# Altium footprint library IC.PcbLib: 97 footprints (part 1 of 7)
Each footprint in its own frame and in the unit in brackets; x right, y up, seen from the top. Pads: shape width x height; smd on the part's side, far side on the other; paste and mask are expansions set on the pad; w line width, h text height; cw(c..) or ccw(c..) is an arc to the next point about the centre after c.
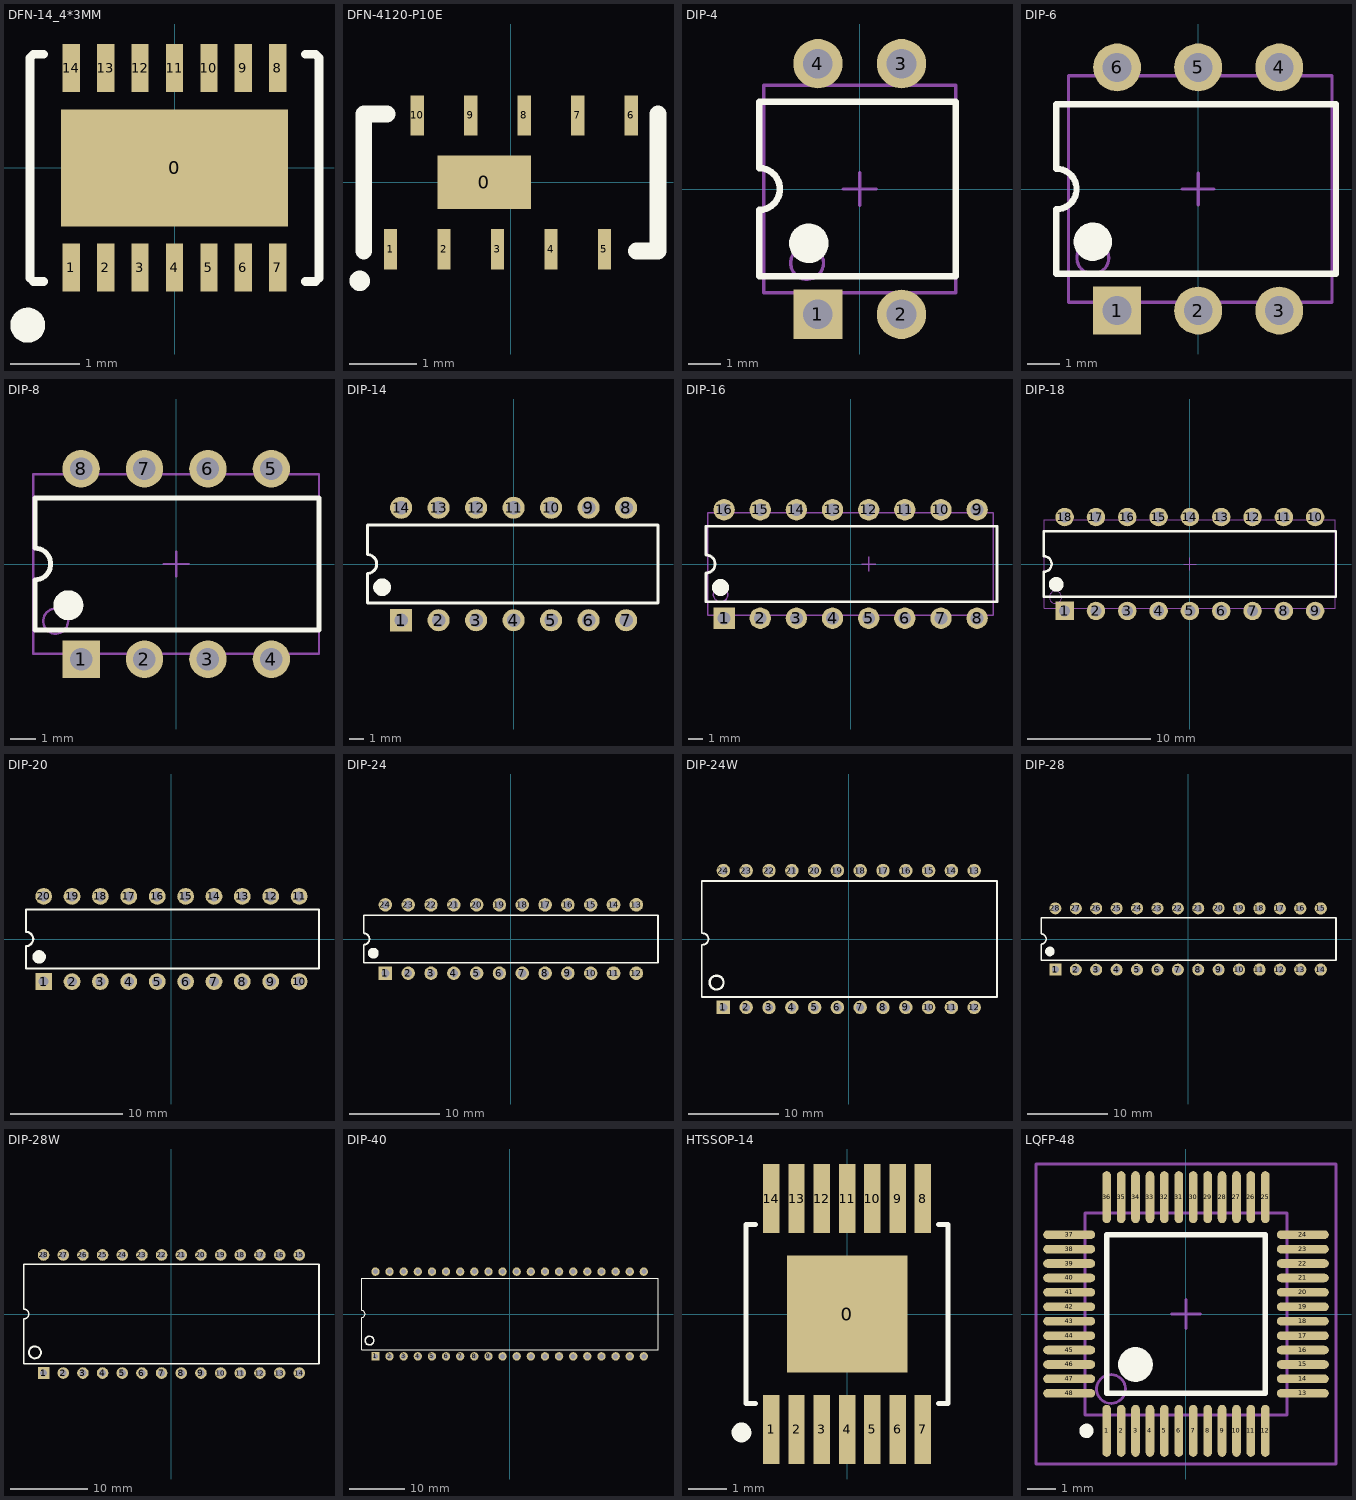
[diagram p0: the footprints below, top view; thin cyan lines are the x and y axes]

## DFN-14_4*3MM [mm]
pads (15):
  rect 3.3x1.7 smd: 0(0,0)
  rect 0.25x0.7 smd: 1(-1.5,-1.45) 2(-1,-1.45) 3(-0.5,-1.45) 4(0,-1.45) 5(0.5,-1.45) 6(1,-1.45) 7(1.5,-1.45) 8(1.5,1.45) 9(1,1.45) 10(0.5,1.45) 11(0,1.45) 12(-0.5,1.45) 13(-1,1.45) 14(-1.5,1.45)
Top Overlay:
  circle w0.254: c-2.134,-2.286 r0.127
  lines w0.127: -1.905,-1.651 -2.049,-1.651 -2.1,-1.6 -2.1,1.6 -2.049,1.651 -1.905,1.651 ; 1.905,-1.651 2.049,-1.651 2.1,-1.6 2.1,1.6 2.049,1.651 1.905,1.651
3D body "User Library-DFN-14.STEP": height 0.75, standoff 0, extent -2.007,-1.5 1.993,1.5

## DFN-4120-P10E [mm]
pads (11):
  rect 1.4x0.8 smd: 0(-0.4,0)
  rect 0.2x0.6 smd: 1(-1.8,-1) 2(-1,-1) 3(-0.2,-1) 4(0.6,-1) 5(1.4,-1) 6(1.8,1) 7(1,1) 8(0.2,1) 9(-0.6,1) 10(-1.4,1)
Top Overlay:
  circle w0.254: c-2.261,-1.473 r0.025
  lines w0.254: -2.2,-1.025 -2.2,1.025 -1.854,1.025 ; 1.88,-1.025 2.2,-1.025 2.2,1.025

## DIP-4 [mm] "DIP; 4 Leads; Row Spacing 7.62 mm; Pitch 2.54 mm"
height 5.6
pads (4):
  rect 1.5x1.5 hole 0.9: 1(-1.27,-3.81)
  round 1.5 hole 0.9: 2(1.27,-3.81) 3(1.27,3.81) 4(-1.27,3.81)
Top Overlay:
  circle w0.6: c-1.55,-1.65 r0.3
  lines w0.2: -3.058,-2.65 -3.058,-0.635 ccw(c-3.058,0) -3.058,0.635 -3.058,2.65 ; -3.048,-2.65 2.921,-2.65 2.921,2.65 -3.048,2.65
Mechanical 13:
  circle w0.1: c-1.6,-2.25 r0.5
  lines w0.1: -2.921,-3.15 2.921,-3.15 2.921,3.15 -2.921,3.15 -2.921,-3.15
Mechanical 15:
  lines w0.1: -0.5,0 0.5,0 ; 0,-0.5 0,0.5
3D body "CircuitWorks-DIP4.step": height 4.31, standoff -3.28, extent -2.794,-4 2.746,4

## DIP-6 [mm] "DIP; 6 Leads; Row Spacing 7.62 mm; Pitch 2.54 mm"
height 5.46
pads (6):
  rect 1.5x1.5 hole 0.9: 1(-2.54,-3.81)
  round 1.5 hole 0.9: 2(0,-3.81) 3(2.54,-3.81) 4(2.54,3.81) 5(0,3.81) 6(-2.54,3.81)
Top Overlay:
  circle w0.6: c-3.302,-1.651 r0.3
  lines w0.2: -4.446,-2.65 -4.446,-0.635 ccw(c-4.446,0) -4.446,0.635 -4.446,2.65 ; -4.445,-2.65 4.318,-2.65 4.318,2.65 -4.445,2.65
Mechanical 13:
  circle w0.1: c-3.302,-2.159 r0.5
  lines w0.1: -4.064,-3.55 4.191,-3.55 4.191,3.55 -4.064,3.55 -4.064,-3.55
Mechanical 15:
  lines w0.1: -0.5,0 0.5,0 ; 0,-0.5 0,0.5
3D body "CircuitWorks-DIP6.step": height 4.31, standoff -3.28, extent -4.016,-4 4.064,4

## DIP-8 [mm] "DIP; 8 Leads; Row Spacing 7.62 mm; Pitch 2.54 mm"
height 5.08
pads (8):
  rect 1.5x1.5 hole 0.9: 1(-3.81,-3.81)
  round 1.5 hole 0.9: 2(-1.27,-3.81) 3(1.27,-3.81) 4(3.81,-3.81) 5(3.81,3.81) 6(1.27,3.81) 7(-1.27,3.81) 8(-3.81,3.81)
Top Overlay:
  circle w0.6: c-4.318,-1.651 r0.3
  lines w0.2: -5.658,-2.65 -5.658,-0.635 ccw(c-5.658,0) -5.658,0.635 -5.658,2.65 ; -5.15,-2.65 5.715,-2.65 5.715,2.65 -5.15,2.65
  lines w0.203: -5.658,-2.65 -4.699,-2.65 ; -5.658,2.65 -4.826,2.65
Mechanical 13:
  circle w0.1: c-4.826,-2.286 r0.5
  lines w0.1: -5.715,-3.6 5.715,-3.6 5.715,3.6 -5.715,3.6 -5.715,-3.6
Mechanical 15:
  lines w0.1: -0.5,0 0.5,0 ; 0,-0.5 0,0.5
3D body "CircuitWorks-DIP8.step": height 4.19, standoff -2.67, extent -5.715,-3.937 5.715,3.937

## DIP-14 [mm] "DIP; 14 Leads; Row Spacing 7.62 mm; Pitch 2.54 mm"
height 5.1
pads (14):
  rect 1.5x1.5 hole 0.9: 1(-7.62,-3.81)
  round 1.5 hole 0.9: 2(-5.08,-3.81) 3(-2.54,-3.81) 4(0,-3.81) 5(2.54,-3.81) 6(5.08,-3.81) 7(7.62,-3.81) 8(7.62,3.81) 9(5.08,3.81) 10(2.54,3.81) 11(0,3.81) 12(-2.54,3.81) 13(-5.08,3.81) 14(-7.62,3.81)
Top Overlay:
  circle w0.6: c-8.916,-1.575 r0.3
  lines w0.2: -9.906,-2.65 -9.906,-0.635 ccw(c-9.906,0) -9.906,0.635 -9.906,2.65 9.779,2.65 9.779,-2.65 -9.906,-2.65
3D body "CircuitWorks-DIP-14.step": height 4.05, standoff -2.93, extent -9.525,-4 9.525,4

## DIP-16 [mm] "DIP; 16 Leads; Row Spacing 7.62 mm; Pitch 2.54 mm"
height 5.08
pads (16):
  rect 1.5x1.5 hole 0.9: 1(-8.89,-3.81)
  round 1.5 hole 0.9: 2(-6.35,-3.81) 3(-3.81,-3.81) 4(-1.27,-3.81) 5(1.27,-3.81) 6(3.81,-3.81) 7(6.35,-3.81) 8(8.89,-3.81) 9(8.89,3.81) 10(6.35,3.81) 11(3.81,3.81) 12(1.27,3.81) 13(-1.27,3.81) 14(-3.81,3.81) 15(-6.35,3.81) 16(-8.89,3.81)
Top Overlay:
  circle w0.6: c-9.144,-1.651 r0.3
  lines w0.2: -10.16,-2.65 -10.16,-0.635 ccw(c-10.16,0) -10.16,0.635 -10.16,2.65 10.287,2.65 10.287,-2.65 -10.16,-2.65
Mechanical 13:
  circle w0.1: c-9.144,-2.159 r0.5
  lines w0.1: -10.033,-3.6 -10.033,3.6 10.033,3.6 10.033,-3.6 -10.033,-3.6
Mechanical 15:
  lines w0.1: 0.77,0 1.77,0 ; 1.27,-0.5 1.27,0.5
3D body "User Library-DIP16-300.step": height 5.08, standoff -2.49, extent -10,-3.935 10,3.935

## DIP-18 [mm] "DIP; 18 Leads; Row Spacing 7.62 mm; Pitch 2.54 mm"
height 5.08
pads (18):
  rect 1.5x1.5 hole 0.9: 1(-10.16,-3.81)
  round 1.5 hole 0.9: 2(-7.62,-3.81) 3(-5.08,-3.81) 4(-2.54,-3.81) 5(0,-3.81) 6(2.54,-3.81) 7(5.08,-3.81) 8(7.62,-3.81) 9(10.16,-3.81) 10(10.16,3.81) 11(7.62,3.81) 12(5.08,3.81) 13(2.54,3.81) 14(0,3.81) 15(-2.54,3.81) 16(-5.08,3.81) 17(-7.62,3.81) 18(-10.16,3.81)
Top Overlay:
  circle w0.6: c-10.85,-1.65 r0.3
  lines w0.2: -11.85,-2.65 -11.85,-0.635 ccw(c-11.85,0) -11.85,0.635 -11.85,2.65 11.85,2.65 11.85,-2.65 -11.85,-2.65
Mechanical 13:
  circle w0.1: c-10.9,-2.7 r0.5
  lines w0.1: -11.8,-3.6 -11.8,3.6 11.8,3.6 11.8,-3.6 -11.8,-3.6
Mechanical 15:
  lines w0.1: -0.5,0 0.5,0 ; 0,-0.5 0,0.5
3D body "User Library-DIP18-300.step": height 5.08, standoff -2.49, extent -11.495,-3.935 11.495,3.935

## DIP-20 [mm] "DIP; 20 Leads; Row Spacing 7.62 mm; Pitch 2.54 mm"
height 5.08
pads (20):
  rect 1.5x1.5 hole 0.9: 1(-11.43,-3.81)
  round 1.5 hole 0.9: 2(-8.89,-3.81) 3(-6.35,-3.81) 4(-3.81,-3.81) 5(-1.27,-3.81) 6(1.27,-3.81) 7(3.81,-3.81) 8(6.35,-3.81) 9(8.89,-3.81) 10(11.43,-3.81) 11(11.43,3.81) 12(8.89,3.81) 13(6.35,3.81) 14(3.81,3.81) 15(1.27,3.81) 16(-1.27,3.81) 17(-3.81,3.81) 18(-6.35,3.81) 19(-8.89,3.81) 20(-11.43,3.81)
Top Overlay:
  circle w0.6: c-11.836,-1.6 r0.3
  lines w0.2: -13,-2.65 -13,-0.635 ccw(c-13,0) -13,0.635 -13,2.65 13.208,2.65 13.208,-2.65 -13,-2.65
3D body "User Library-20 pin dip.step": height 4.7, standoff -1.52, extent -12.827,-3.937 12.954,3.937

## DIP-24 [mm] "DIP; 24Leads; Row Spacing 7.62 mm; Pitch 2.54 mm"
height 5.08
pads (24):
  rect 1.5x1.5 hole 0.9: 1(-13.97,-3.81)
  round 1.5 hole 0.9: 2(-11.43,-3.81) 3(-8.89,-3.81) 4(-6.35,-3.81) 5(-3.81,-3.81) 6(-1.27,-3.81) 7(1.27,-3.81) 8(3.81,-3.81) 9(6.35,-3.81) 10(8.89,-3.81) 15(8.89,3.81) 16(6.35,3.81) 17(3.81,3.81) 18(1.27,3.81) 19(-1.27,3.81) 20(-3.81,3.81) 21(-6.35,3.81) 22(-8.89,3.81) 23(-11.43,3.81) 24(-13.97,3.81)
  round 1.524 hole 0.762: 11(11.43,-3.81) 12(13.97,-3.81) 13(13.97,3.81) 14(11.43,3.81)
Top Overlay:
  circle w0.6: c-15.316,-1.575 r0.3
  lines w0.2: -16.383,-2.65 16.383,-2.65 16.383,2.65 -16.383,2.65 -16.383,0.635 cw(c-16.383,0) -16.383,-0.635 -16.383,-2.65
3D body "User Library-DIP24-300.step": height 5.08, standoff -2.49, extent -16.129,-4.064 16.131,3.806

## DIP-24W [mm] "DIP; 24 Leads; Row Spacing 15.24 mm; Pitch 2.54 mm"
height 5.16
pads (24):
  rect 1.5x1.5 hole 0.9: 1(-13.97,-7.62)
  round 1.5 hole 0.9: 2(-11.43,-7.62) 3(-8.89,-7.62) 4(-6.35,-7.62) 5(-3.81,-7.62) 6(-1.27,-7.62) 7(1.27,-7.62) 8(3.81,-7.62) 9(6.35,-7.62) 10(8.89,-7.62) 11(11.43,-7.62) 12(13.97,-7.62) 13(13.97,7.62) 14(11.43,7.62) 15(8.89,7.62) 16(6.35,7.62) 17(3.81,7.62) 18(1.27,7.62) 19(-1.27,7.62) 20(-3.81,7.62) 21(-6.35,7.62) 22(-8.89,7.62) 23(-11.43,7.62) 24(-13.97,7.62)
Top Overlay:
  circle w0.254: c-14.732,-4.851 r0.773
  lines w0.2: -16.277,-0.635 ccw(c-16.277,0) -16.277,0.635 ; -16.15,-0.635 -16.383,-0.635 -16.383,-6.45 16.51,-6.45 16.51,6.45 -16.383,6.45 -16.383,0.635 -16.15,0.635
3D body "User Library-DIP24-600.step": height 5.7, standoff -2.58, extent -16.129,-7.743 16.131,7.747

## DIP-28 [mm] "DIP; 28Leads; Row Spacing 7.62 mm; Pitch 2.54 mm"
height 5.08
pads (28):
  rect 1.5x1.5 hole 0.9: 1(-16.51,-3.81)
  round 1.5 hole 0.9: 2(-13.97,-3.81) 3(-11.43,-3.81) 4(-8.89,-3.81) 5(-6.35,-3.81) 6(-3.81,-3.81) 7(-1.27,-3.81) 8(1.27,-3.81) 9(3.81,-3.81) 10(6.35,-3.81) 12(11.43,-3.81) 17(11.43,3.81) 19(6.35,3.81) 20(3.81,3.81) 21(1.27,3.81) 22(-1.27,3.81) 23(-3.81,3.81) 24(-6.35,3.81) 25(-8.89,3.81) 26(-11.43,3.81) 27(-13.97,3.81) 28(-16.51,3.81)
  round 1.524 hole 0.762: 11(8.89,-3.81) 13(13.97,-3.81) 14(16.51,-3.81) 15(16.51,3.81) 16(13.97,3.81) 18(8.89,3.81)
Top Overlay:
  circle w0.6: c-17.196,-1.549 r0.3
  lines w0.2: -18.288,-2.65 -18.288,-0.635 ccw(c-18.288,0) -18.288,0.635 -18.288,2.65 18.415,2.65 18.415,-2.65 -18.288,-2.65
3D body "User Library-DIP28-300.step": height 5.08, standoff -2.49, extent -18,-3.933 18,3.937

## DIP-28W [mm] "DIP; 28 Leads; Row Spacing 15.24 mm; Pitch 2.54 mm"
height 5.16
pads (28):
  rect 1.5x1.5 hole 0.9: 1(-16.51,-7.62)
  round 1.5 hole 0.9: 2(-13.97,-7.62) 3(-11.43,-7.62) 4(-8.89,-7.62) 5(-6.35,-7.62) 6(-3.81,-7.62) 7(-1.27,-7.62) 8(1.27,-7.62) 9(3.81,-7.62) 10(6.35,-7.62) 11(8.89,-7.62) 12(11.43,-7.62) 13(13.97,-7.62) 14(16.51,-7.62) 15(16.51,7.62) 16(13.97,7.62) 17(11.43,7.62) 18(8.89,7.62) 19(6.35,7.62) 20(3.81,7.62) 21(1.27,7.62) 22(-1.27,7.62) 23(-3.81,7.62) 24(-6.35,7.62) 25(-8.89,7.62) 26(-11.43,7.62) 27(-13.97,7.62) 28(-16.51,7.62)
Top Overlay:
  circle w0.254: c-17.628,-4.953 r0.773
  lines w0.2: -19.05,-6.45 -19.05,-0.635 ccw(c-19.05,0) -19.05,0.635 -19.05,6.45 19.05,6.45 19.05,-6.45 -19.05,-6.45
3D body "User Library-DIP28-600.step": height 5.7, standoff -2.58, extent -18.65,-7.618 18.65,7.872

## DIP-40 [mm] "DIP; 40 Leads; Row Spacing 15.24 mm; Pitch 2.54 mm"
height 5.16
pads (40):
  rect 1.5x1.5 hole 0.9: 1(-24.13,-7.62)
  round 1.5 hole 0.9: 2(-21.59,-7.62) 3(-19.05,-7.62) 4(-16.51,-7.62) 5(-13.97,-7.62) 6(-11.43,-7.62) 7(-8.89,-7.62) 8(-6.35,-7.62) 9(-3.81,-7.62) 10(-1.27,-7.62) 11(1.27,-7.62) 12(3.81,-7.62) 13(6.35,-7.62) 14(8.89,-7.62) 15(11.43,-7.62) 16(13.97,-7.62) 17(16.51,-7.62) 18(19.05,-7.62) 19(21.59,-7.62) 20(24.13,-7.62) 21(24.13,7.62) 22(21.59,7.62) 23(19.05,7.62) 24(16.51,7.62) 25(13.97,7.62) 26(11.43,7.62) 27(8.89,7.62) 28(6.35,7.62) 29(3.81,7.62) 30(1.27,7.62) 31(-1.27,7.62) 32(-3.81,7.62) 33(-6.35,7.62) 34(-8.89,7.62) 35(-11.43,7.62) 36(-13.97,7.62) 37(-16.51,7.62) 38(-19.05,7.62) 39(-21.59,7.62) 40(-24.13,7.62)
Top Overlay:
  circle w0.254: c-25.197,-4.775 r0.773
  lines w0.2: -26.627,-6.393 -26.627,-0.635 ccw(c-26.627,0) -26.627,0.635 -26.627,6.393 -26.57,6.45 26.67,6.45 26.67,-6.45 -26.57,-6.45 -26.627,-6.393
3D body "User Library-DIP40-600.step": height 5.7, standoff -2.58, extent -26.161,-7.745 26.289,7.745

## HTSSOP-14 [mm] "LM3150 42V Synchronous Step-Down"
height 1.1
pads (15):
  rect 3.1x3 smd: 0(0,0)
  rect 0.42x1.78 smd: 1(-1.95,-2.97) 2(-1.3,-2.97) 3(-0.65,-2.97) 4(0,-2.97) 5(0.65,-2.97) 6(1.3,-2.97) 7(1.95,-2.97) 8(1.95,2.97) 9(1.3,2.97) 10(0.65,2.97) 11(0,2.97) 12(-0.65,2.97) 13(-1.3,2.97) 14(-1.95,2.97)
Top Overlay:
  lines w0.127: -2.35,-2.3 -2.6,-2.3 -2.6,2.3 -2.35,2.3 ; 2.35,-2.3 2.6,-2.3 2.6,2.3 2.35,2.3
  lines w0.254: -2.758,-2.928 ccw(c-2.718,-3.048) -2.739,-2.923
3D body "User Library-HTSSOP14.step": height 1.1, standoff 0, extent -2.491,-3.14 2.491,3.242

## LQFP-48 [mm] "Thin QFP, 48-Leads, Body 7x7mm, Pitch 0.5mm, IPC Medium Density"
height 1.6
pads (48):
  oval 0.3x1.8 smd: 1(-2.75,-4.05) 2(-2.25,-4.05) 3(-1.75,-4.05) 4(-1.25,-4.05) 5(-0.75,-4.05) 6(-0.25,-4.05) 7(0.25,-4.05) 8(0.75,-4.05) 9(1.25,-4.05) 10(1.75,-4.05) 11(2.25,-4.05) 12(2.75,-4.05) 25(2.75,4.05) 26(2.25,4.05) 27(1.75,4.05) 28(1.25,4.05) 29(0.75,4.05) 30(0.25,4.05) 31(-0.25,4.05) 32(-0.75,4.05) 33(-1.25,4.05) 34(-1.75,4.05) 35(-2.25,4.05) 36(-2.75,4.05)
  oval 1.8x0.3 smd: 13(4.05,-2.75) 14(4.05,-2.25) 15(4.05,-1.75) 16(4.05,-1.25) 17(4.05,-0.75) 18(4.05,-0.25) 19(4.05,0.25) 20(4.05,0.75) 21(4.05,1.25) 22(4.05,1.75) 23(4.05,2.25) 24(4.05,2.75) 37(-4.05,2.75) 38(-4.05,2.25) 39(-4.05,1.75) 40(-4.05,1.25) 41(-4.05,0.75) 42(-4.05,0.25) 43(-4.05,-0.25) 44(-4.05,-0.75) 45(-4.05,-1.25) 46(-4.05,-1.75) 47(-4.05,-2.25) 48(-4.05,-2.75)
Top Overlay:
  circle w0.25: c-3.45,-4.05 r0.125
  circle w0.6: c-1.75,-1.75 r0.3
  lines w0.2: -2.75,-2.75 2.75,-2.75 2.75,2.75 -2.75,2.75 -2.75,-2.75
Mechanical 13:
  circle w0.1: c-2.6,-2.6 r0.5
  lines w0.1: -3.5,-3.5 3.5,-3.5 3.5,3.5 -3.5,3.5 -3.5,-3.5
Mechanical 15:
  lines w0.1: -0.5,0 0.5,0 ; 0,-0.5 0,0.5 ; -5.2,-5.2 5.2,-5.2 5.2,5.2 -5.2,5.2 -5.2,-5.2
3D body: height 1.6, standoff 0, extent -3.5,-3.5 3.5,3.5